# Altium footprint library HARTING THD.PcbLib: 113 footprints (part 3 of 11)
Each footprint in its own frame and in the unit in brackets; x right, y up, seen from the top. Pads: shape width x height; smd on the part's side, far side on the other; paste and mask are expansions set on the pad; w line width, h text height; cw(c..) or ccw(c..) is an arc to the next point about the centre after c.
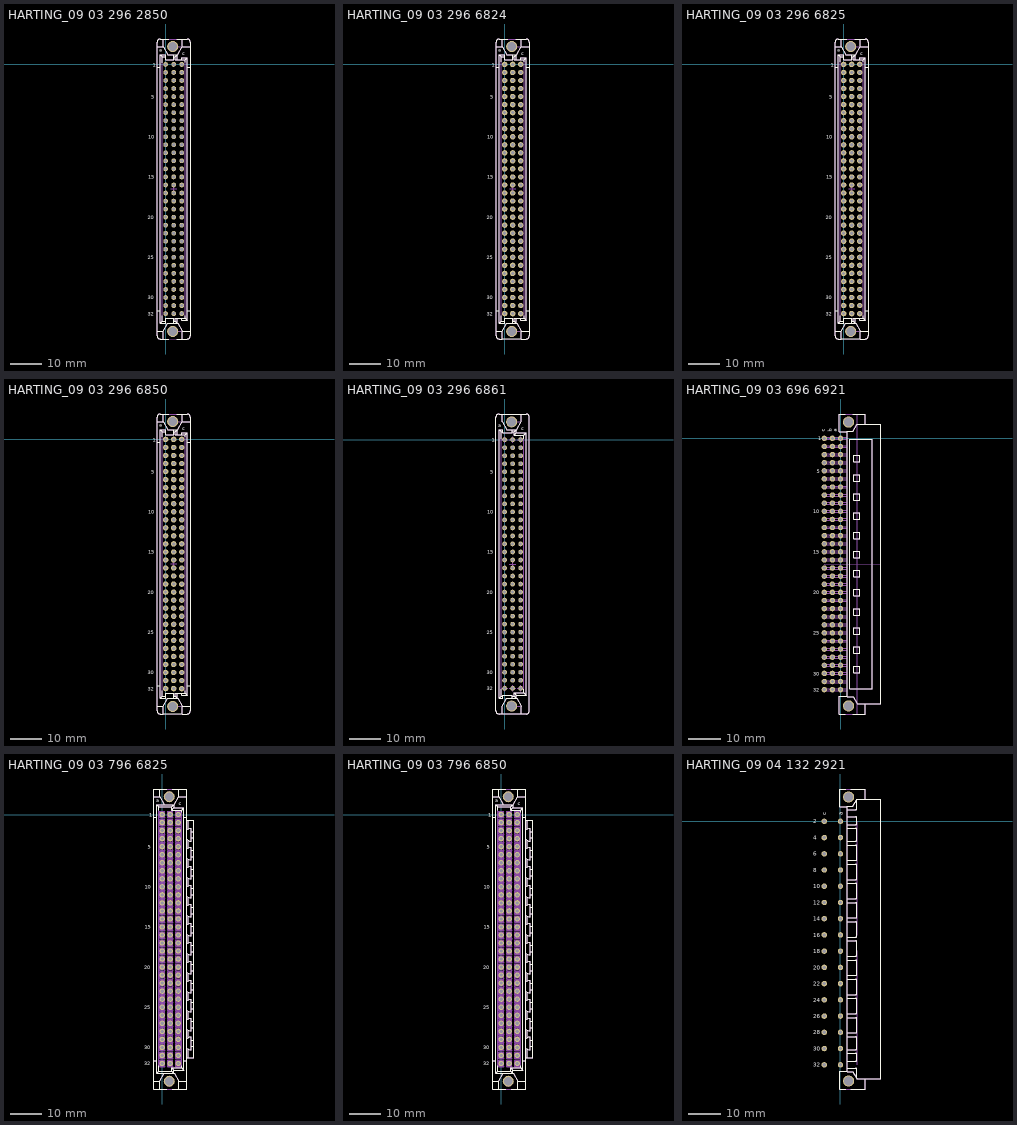
[diagram p2: the footprints below, top view; thin cyan lines are the x and y axes]

## HARTING_09 03 296 2850 [mm] "DIN 41612, Type C,  Thru-Hole Press-in Terminations; Rows a+b+c, 96 Position, Performance level 1, Lead 4.5mm, Pitch 2.54mm, Straight Female Connector"
height 11.6
pads (98):
  round 1.5 hole 1: a1(0,0) a2(0,-2.54) a3(0,-5.08) a4(0,-7.62) a5(0,-10.16) a6(0,-12.7) a7(0,-15.24) a8(0,-17.78) a9(0,-20.32) a10(0,-22.86) a11(0,-25.4) a12(0,-27.94) a13(0,-30.48) a14(0,-33.02) a15(0,-35.56) a16(0,-38.1) a17(0,-40.64) a18(0,-43.18) a19(0,-45.72) a20(0,-48.26) a21(0,-50.8) a22(0,-53.34) a23(0,-55.88) a24(0,-58.42) a25(0,-60.96) a26(0,-63.5) a27(0,-66.04) a28(0,-68.58) a29(0,-71.12) a30(0,-73.66) a31(0,-76.2) a32(0,-78.74) b1(2.54,0) b2(2.54,-2.54) b3(2.54,-5.08) b4(2.54,-7.62) b5(2.54,-10.16) b6(2.54,-12.7) b7(2.54,-15.24) b8(2.54,-17.78) b9(2.54,-20.32) b10(2.54,-22.86) b11(2.54,-25.4) b12(2.54,-27.94) b13(2.54,-30.48) b14(2.54,-33.02) b15(2.54,-35.56) b16(2.54,-38.1) b17(2.54,-40.64) b18(2.54,-43.18) b19(2.54,-45.72) b20(2.54,-48.26) b21(2.54,-50.8) b22(2.54,-53.34) b23(2.54,-55.88) b24(2.54,-58.42) b25(2.54,-60.96) b26(2.54,-63.5) b27(2.54,-66.04) b28(2.54,-68.58) b29(2.54,-71.12) b30(2.54,-73.66) b31(2.54,-76.2) b32(2.54,-78.74) c1(5.08,0) c2(5.08,-2.54) c3(5.08,-5.08) c4(5.08,-7.62) c5(5.08,-10.16) c6(5.08,-12.7) c7(5.08,-15.24) c8(5.08,-17.78) c9(5.08,-20.32) c10(5.08,-22.86) c11(5.08,-25.4) c12(5.08,-27.94) c13(5.08,-30.48) c14(5.08,-33.02) c15(5.08,-35.56) c16(5.08,-38.1) c17(5.08,-40.64) c18(5.08,-43.18) c19(5.08,-45.72) c20(5.08,-48.26) c21(5.08,-50.8) c22(5.08,-53.34) c23(5.08,-55.88) c24(5.08,-58.42) c25(5.08,-60.96) c26(5.08,-63.5) c27(5.08,-66.04) c28(5.08,-68.58) c29(5.08,-71.12) c30(5.08,-73.66) c31(5.08,-76.2) c32(5.08,-78.74)
  round 3.5 / inner round 3.5 / far side round 5.1 hole 2.8: MTG1(2.24,5.63) MTG2(2.24,-84.37)
Top Overlay:
  lines w0.2: -2.71,-84.37 -0.735,-84.37 ; -2.71,-77.87 -1.685,-77.87 ; -1.685,-0.87 -2.71,-0.87 -2.71,5.63 -0.735,5.63 ; -1.035,-79.41 -1.035,-81.195 ; -1.035,0.55 -1.035,2.455 ; 1,-86.77 -0.735,-86.77 ; 1,8.03 -0.735,8.03 ; 2.54,-81.845 2.54,-81.195 ; 2.54,3.105 2.54,2.455 ; 3.5,-86.77 5.215,-86.77 ; 3.5,8.03 5.215,8.03 ; 3.665,-80.145 3.665,-81.845 3.015,-81.195 ; 3.665,1.405 3.665,3.105 3.015,2.455 ; 6.115,-79.345 6.115,-80.145 ; 6.115,0.605 6.115,1.405 ; 6.765,-77.87 7.79,-77.87 ; 6.765,-0.87 7.79,-0.87 ; 7.79,-84.37 5.215,-84.37 ; 7.79,5.63 5.215,5.63 ; -1.685,-81.845 -1.685,3.105 ; -1.685,-81.845 -1.035,-81.195 ; -1.685,-81.845 0,-81.845 0,-81.195 ; -1.685,3.105 0,3.105 0,2.455 ; -1.685,3.105 -1.035,2.455 ; -1.035,-81.195 0,-81.195 ; -1.035,2.455 0,2.455 ; -0.735,-86.77 -0.735,-84.37 ; -0.735,-86.77 -1.71,-86.77 cw(c-1.71,-85.77) -2.71,-85.77 -2.71,7.03 cw(c-1.71,7.03) -1.71,8.03 -0.735,8.03 ; -0.735,-84.37 0.723,-81.845 3.757,-81.845 5.215,-84.37 ; -0.735,5.63 -0.735,8.03 ; -0.735,5.63 0.723,3.105 3.757,3.105 5.215,5.63 ; 0,-81.195 0,-80.145 2.54,-80.145 2.54,-81.195 ; 0,2.455 0,1.405 2.54,1.405 2.54,2.455 ; 2.54,-81.195 3.015,-81.195 ; 2.54,2.455 3.015,2.455 ; 3.015,-81.195 3.015,-80.145 5.08,-80.145 ; 3.015,2.455 3.015,1.405 5.08,1.405 ; 5.08,-80.145 6.115,-80.145 ; 5.08,-80.145 5.08,-80.795 6.765,-80.795 ; 5.08,1.405 5.08,2.055 6.765,2.055 ; 5.08,1.405 6.115,1.405 ; 5.215,-86.77 5.215,-84.37 ; 5.215,-86.77 6.79,-86.77 ccw(c6.79,-85.77) 7.79,-85.77 7.79,7.03 ccw(c6.79,7.03) 6.79,8.03 5.215,8.03 ; 5.215,5.63 5.215,8.03 ; 6.115,-80.145 6.765,-80.795 ; 6.115,1.405 6.765,2.055 ; 6.765,-80.795 6.765,2.055
  text "a" at -1.951,3.96 h1.2
  text "c" at 5.305,2.935 h1.2
  text "10" at -5.475,-23.46 h1.2
  text "32" at -5.675,-79.365 h1.2
  text "5" at -4.55,-10.835 h1.2
  text "30" at -5.675,-74.285 h1.2
  text "25" at -5.675,-61.585 h1.2
  text "20" at -5.675,-48.885 h1.2
  text "15" at -5.475,-36.135 h1.2
  text "1" at -4.075,-0.675 h1.2
Mechanical 8:
  lines w0.1: 1.54,-39.37 2.54,-39.37 ; 2.24,-84.37 4.78,-84.37 ; 2.24,5.63 4.78,5.63 ; 2.54,-40.37 2.54,-39.37 ; 2.54,-38.37 2.54,-39.37 ; 3.54,-39.37 2.54,-39.37
Mechanical 14:
  circle w0.1: c2.24,5.63 r1.425
  circle w0.1: c2.24,-84.37 r1.425
  lines w0.1: -2.71,-84.37 -0.735,-84.37 ; -2.71,5.63 -0.735,5.63 ; -0.735,-86.77 -0.735,-84.37 ; -0.735,8.03 -0.735,5.63 ; 3.665,-80.145 3.665,-81.845 ; 3.665,1.405 3.665,3.105 3.015,2.455 ; 3.757,3.105 5.215,5.63 ; 5.215,-86.77 5.215,-84.37 ; 5.215,8.03 5.215,5.63 ; 7.79,-84.37 5.215,-84.37 ; 7.79,5.63 5.215,5.63 ; -1.685,-81.845 -1.685,3.105 ; -1.685,-81.845 0,-81.845 0,-81.195 ; -1.685,-81.845 -1.035,-81.195 ; -1.685,3.105 0,3.105 0,2.455 ; -1.685,3.105 -1.035,2.455 ; -1.035,-81.195 0,-81.195 ; -1.035,-81.195 -1.035,2.455 ; -1.035,2.455 0,2.455 ; -0.735,-84.37 0.723,-81.845 2.54,-81.845 ; -0.735,5.63 0.723,3.105 2.54,3.105 2.54,2.455 ; 0,-81.195 0,-80.145 2.54,-80.145 2.54,-81.195 ; 0,2.455 0,1.405 2.54,1.405 2.54,2.455 ; 2.54,-81.845 3.665,-81.845 ; 2.54,-81.845 2.54,-81.195 ; 2.54,-81.195 3.015,-81.195 ; 2.54,2.455 3.015,2.455 ; 3.015,-81.195 3.665,-81.845 ; 3.015,-81.195 3.015,-80.145 5.08,-80.145 ; 3.015,2.455 3.015,1.405 5.08,1.405 ; 3.665,-81.845 3.757,-81.845 5.215,-84.37 ; 5.08,-80.145 5.08,-80.795 6.765,-80.795 ; 5.08,-80.145 6.115,-80.145 ; 5.08,1.405 5.08,2.055 6.765,2.055 ; 5.08,1.405 6.115,1.405 ; 6.115,-80.145 6.765,-80.795 ; 6.115,-80.145 6.115,1.405 ; 6.115,1.405 6.765,2.055 ; 6.765,-80.795 6.765,2.055 ; -2.71,-85.77 ccw(c-1.71,-85.77) -1.71,-86.77 6.79,-86.77 ccw(c6.79,-85.77) 7.79,-85.77 7.79,7.03 ccw(c6.79,7.03) 6.79,8.03 -1.71,8.03 ccw(c-1.71,7.03) -2.71,7.03 -2.71,-85.77
  text "a" at -1.951,3.96 h1.2
  text "c" at 5.305,2.935 h1.2
  text "10" at -5.475,-23.46 h1.2
  text "32" at -5.675,-79.365 h1.2
  text "5" at -4.55,-10.835 h1.2
  text "30" at -5.675,-74.285 h1.2
  text "25" at -5.675,-61.585 h1.2
  text "20" at -5.675,-48.885 h1.2
  text "15" at -5.475,-36.135 h1.2
  text "1" at -4.075,-0.675 h1.2
Drill Drawing:
  lines w0.1: -2.54,-58.42 -2.54,-81.28 7.62,-81.28 7.62,2.54 -2.54,2.54 -2.54,-20.32
  text "PRESS-FIT TECHNOLOGY diam. 1mm +0.1 -0" at -1.905,-56.515 h1
3D body "HARTING_09 03 296 2850.stp": height 11.6, standoff -4.5, extent -2.71,-86.82 7.79,8.08

## HARTING_09 03 296 6824 [mm] "DIN 41612, Type C,  Thru-Hole; Rows a+b+c, 96 Position, Performance level 2, Lead 2.9mm, Pitch 2.54mm, Straight Female Connector"
height 11.6
pads (98):
  round 1.7 hole 1: a1(0,0) a2(0,-2.54) a3(0,-5.08) a4(0,-7.62) a5(0,-10.16) a6(0,-12.7) a7(0,-15.24) a8(0,-17.78) a9(0,-20.32) a10(0,-22.86) a11(0,-25.4) a12(0,-27.94) a13(0,-30.48) a14(0,-33.02) a15(0,-35.56) a16(0,-38.1) a17(0,-40.64) a18(0,-43.18) a19(0,-45.72) a20(0,-48.26) a21(0,-50.8) a22(0,-53.34) a23(0,-55.88) a24(0,-58.42) a25(0,-60.96) a26(0,-63.5) a27(0,-66.04) a28(0,-68.58) a29(0,-71.12) a30(0,-73.66) a31(0,-76.2) a32(0,-78.74) b1(2.54,0) b2(2.54,-2.54) b3(2.54,-5.08) b4(2.54,-7.62) b5(2.54,-10.16) b6(2.54,-12.7) b7(2.54,-15.24) b8(2.54,-17.78) b9(2.54,-20.32) b10(2.54,-22.86) b11(2.54,-25.4) b12(2.54,-27.94) b13(2.54,-30.48) b14(2.54,-33.02) b15(2.54,-35.56) b16(2.54,-38.1) b17(2.54,-40.64) b18(2.54,-43.18) b19(2.54,-45.72) b20(2.54,-48.26) b21(2.54,-50.8) b22(2.54,-53.34) b23(2.54,-55.88) b24(2.54,-58.42) b25(2.54,-60.96) b26(2.54,-63.5) b27(2.54,-66.04) b28(2.54,-68.58) b29(2.54,-71.12) b30(2.54,-73.66) b31(2.54,-76.2) b32(2.54,-78.74) c1(5.08,0) c2(5.08,-2.54) c3(5.08,-5.08) c4(5.08,-7.62) c5(5.08,-10.16) c6(5.08,-12.7) c7(5.08,-15.24) c8(5.08,-17.78) c9(5.08,-20.32) c10(5.08,-22.86) c11(5.08,-25.4) c12(5.08,-27.94) c13(5.08,-30.48) c14(5.08,-33.02) c15(5.08,-35.56) c16(5.08,-38.1) c17(5.08,-40.64) c18(5.08,-43.18) c19(5.08,-45.72) c20(5.08,-48.26) c21(5.08,-50.8) c22(5.08,-53.34) c23(5.08,-55.88) c24(5.08,-58.42) c25(5.08,-60.96) c26(5.08,-63.5) c27(5.08,-66.04) c28(5.08,-68.58) c29(5.08,-71.12) c30(5.08,-73.66) c31(5.08,-76.2) c32(5.08,-78.74)
  round 3.5 / inner round 3.5 / far side round 5.1 hole 2.8: MTG1(2.24,5.63) MTG2(2.24,-84.37)
Top Overlay:
  lines w0.2: -2.71,-84.37 -0.735,-84.37 ; -2.71,-77.87 -1.685,-77.87 ; -1.685,-0.87 -2.71,-0.87 -2.71,5.63 -0.735,5.63 ; -1.035,-79.4 -1.035,-81.195 ; -1.035,0.775 -1.035,2.455 ; 1,8.03 -0.735,8.03 ; 2.54,-81.845 2.54,-81.195 ; 2.54,3.105 2.54,2.455 ; 3.5,8.03 5.215,8.03 ; 3.665,-80.145 3.665,-81.845 3.015,-81.195 ; 3.665,1.405 3.665,3.105 3.015,2.455 ; 6.115,-79.425 6.115,-80.145 ; 6.115,0.825 6.115,1.405 ; 6.765,-77.87 7.79,-77.87 ; 6.765,-0.87 7.79,-0.87 ; 7.79,-84.37 5.215,-84.37 ; 7.79,5.63 5.215,5.63 ; -1.685,-81.845 0,-81.845 0,-81.195 ; -1.685,-81.845 -1.035,-81.195 ; -1.685,-81.845 -1.685,3.105 ; -1.685,3.105 -1.035,2.455 ; -1.685,3.105 0,3.105 0,2.455 ; -1.035,-81.195 0,-81.195 ; -1.035,2.455 0,2.455 ; -0.735,-86.77 -1.71,-86.77 cw(c-1.71,-85.77) -2.71,-85.77 -2.71,7.03 cw(c-1.71,7.03) -1.71,8.03 -0.735,8.03 ; -0.735,-86.77 5.215,-86.77 ; -0.735,-86.77 -0.735,-84.37 ; -0.735,-84.37 0.723,-81.845 3.757,-81.845 5.215,-84.37 ; -0.735,5.63 0.723,3.105 3.757,3.105 5.215,5.63 ; -0.735,5.63 -0.735,8.03 ; 0,-81.195 0,-80.145 2.54,-80.145 2.54,-81.195 ; 0,2.455 0,1.405 2.54,1.405 2.54,2.455 ; 2.54,-81.195 3.015,-81.195 ; 2.54,2.455 3.015,2.455 ; 3.015,-81.195 3.015,-80.145 5.08,-80.145 ; 3.015,2.455 3.015,1.405 5.08,1.405 ; 5.08,-80.145 5.08,-80.795 6.765,-80.795 ; 5.08,-80.145 6.115,-80.145 ; 5.08,1.405 6.115,1.405 ; 5.08,1.405 5.08,2.055 6.765,2.055 ; 5.215,-86.77 6.79,-86.77 ccw(c6.79,-85.77) 7.79,-85.77 7.79,7.03 ccw(c6.79,7.03) 6.79,8.03 5.215,8.03 ; 5.215,-86.77 5.215,-84.37 ; 5.215,5.63 5.215,8.03 ; 6.115,-80.145 6.765,-80.795 ; 6.115,1.405 6.765,2.055 ; 6.765,-80.795 6.765,2.055
  text "1" at -4.075,-0.675 h1.2
  text "15" at -5.475,-36.135 h1.2
  text "20" at -5.675,-48.885 h1.2
  text "25" at -5.675,-61.585 h1.2
  text "30" at -5.675,-74.285 h1.2
  text "5" at -4.55,-10.835 h1.2
  text "32" at -5.675,-79.365 h1.2
  text "10" at -5.475,-23.46 h1.2
  text "c" at 5.305,2.935 h1.2
  text "a" at -1.951,3.96 h1.2
Mechanical 8:
  lines w0.1: 1.54,-39.37 2.54,-39.37 ; 2.24,-84.37 4.78,-84.37 ; 2.24,5.63 4.78,5.63 ; 2.54,-40.37 2.54,-39.37 ; 2.54,-38.37 2.54,-39.37 ; 3.54,-39.37 2.54,-39.37
Mechanical 14:
  circle w0.1: c2.24,-84.37 r1.425
  circle w0.1: c2.24,5.63 r1.425
  lines w0.1: -2.71,-84.37 -0.735,-84.37 ; -2.71,5.63 -0.735,5.63 ; -0.735,-86.77 -0.735,-84.37 ; -0.735,8.03 -0.735,5.63 ; 3.665,-80.145 3.665,-81.845 ; 3.665,1.405 3.665,3.105 3.015,2.455 ; 3.757,3.105 5.215,5.63 ; 5.215,-86.77 5.215,-84.37 ; 5.215,8.03 5.215,5.63 ; 7.79,-84.37 5.215,-84.37 ; 7.79,5.63 5.215,5.63 ; -1.685,-81.845 -1.035,-81.195 ; -1.685,-81.845 0,-81.845 0,-81.195 ; -1.685,-81.845 -1.685,3.105 ; -1.685,3.105 -1.035,2.455 ; -1.685,3.105 0,3.105 0,2.455 ; -1.035,-81.195 -1.035,2.455 ; -1.035,-81.195 0,-81.195 ; -1.035,2.455 0,2.455 ; -0.735,-84.37 0.723,-81.845 2.54,-81.845 ; -0.735,5.63 0.723,3.105 2.54,3.105 2.54,2.455 ; 0,-81.195 0,-80.145 2.54,-80.145 2.54,-81.195 ; 0,2.455 0,1.405 2.54,1.405 2.54,2.455 ; 2.54,-81.845 2.54,-81.195 ; 2.54,-81.845 3.665,-81.845 ; 2.54,-81.195 3.015,-81.195 ; 2.54,2.455 3.015,2.455 ; 3.015,-81.195 3.015,-80.145 5.08,-80.145 ; 3.015,-81.195 3.665,-81.845 ; 3.015,2.455 3.015,1.405 5.08,1.405 ; 3.665,-81.845 3.757,-81.845 5.215,-84.37 ; 5.08,-80.145 6.115,-80.145 ; 5.08,-80.145 5.08,-80.795 6.765,-80.795 ; 5.08,1.405 6.115,1.405 ; 5.08,1.405 5.08,2.055 6.765,2.055 ; 6.115,-80.145 6.115,1.405 ; 6.115,-80.145 6.765,-80.795 ; 6.115,1.405 6.765,2.055 ; 6.765,-80.795 6.765,2.055 ; -2.71,-85.77 ccw(c-1.71,-85.77) -1.71,-86.77 6.79,-86.77 ccw(c6.79,-85.77) 7.79,-85.77 7.79,7.03 ccw(c6.79,7.03) 6.79,8.03 -1.71,8.03 ccw(c-1.71,7.03) -2.71,7.03 -2.71,-85.77
  text "1" at -4.075,-0.675 h1.2
  text "15" at -5.475,-36.135 h1.2
  text "20" at -5.675,-48.885 h1.2
  text "25" at -5.675,-61.585 h1.2
  text "30" at -5.675,-74.285 h1.2
  text "5" at -4.55,-10.835 h1.2
  text "32" at -5.675,-79.365 h1.2
  text "10" at -5.475,-23.46 h1.2
  text "c" at 5.305,2.935 h1.2
  text "a" at -1.951,3.96 h1.2
3D body "HARTING_09 03 296 6824.stp": height 11.6, standoff -2.9, extent -2.71,-86.82 7.79,8.08

## HARTING_09 03 296 6825 [mm] "DIN 41612, Type C,  Thru-Hole; Rows a+b+c, 96 Position, Performance level 2, Lead 4.5mm, Pitch 2.54mm, Straight Female Connector"
height 11.6
pads (98):
  round 1.7 hole 1: a1(0,0) a2(0,-2.54) a3(0,-5.08) a4(0,-7.62) a5(0,-10.16) a6(0,-12.7) a7(0,-15.24) a8(0,-17.78) a9(0,-20.32) a10(0,-22.86) a11(0,-25.4) a12(0,-27.94) a13(0,-30.48) a14(0,-33.02) a15(0,-35.56) a16(0,-38.1) a17(0,-40.64) a18(0,-43.18) a19(0,-45.72) a20(0,-48.26) a21(0,-50.8) a22(0,-53.34) a23(0,-55.88) a24(0,-58.42) a25(0,-60.96) a26(0,-63.5) a27(0,-66.04) a28(0,-68.58) a29(0,-71.12) a30(0,-73.66) a31(0,-76.2) a32(0,-78.74) b1(2.54,0) b2(2.54,-2.54) b3(2.54,-5.08) b4(2.54,-7.62) b5(2.54,-10.16) b6(2.54,-12.7) b7(2.54,-15.24) b8(2.54,-17.78) b9(2.54,-20.32) b10(2.54,-22.86) b11(2.54,-25.4) b12(2.54,-27.94) b13(2.54,-30.48) b14(2.54,-33.02) b15(2.54,-35.56) b16(2.54,-38.1) b17(2.54,-40.64) b18(2.54,-43.18) b19(2.54,-45.72) b20(2.54,-48.26) b21(2.54,-50.8) b22(2.54,-53.34) b23(2.54,-55.88) b24(2.54,-58.42) b25(2.54,-60.96) b26(2.54,-63.5) b27(2.54,-66.04) b28(2.54,-68.58) b29(2.54,-71.12) b30(2.54,-73.66) b31(2.54,-76.2) b32(2.54,-78.74) c1(5.08,0) c2(5.08,-2.54) c3(5.08,-5.08) c4(5.08,-7.62) c5(5.08,-10.16) c6(5.08,-12.7) c7(5.08,-15.24) c8(5.08,-17.78) c9(5.08,-20.32) c10(5.08,-22.86) c11(5.08,-25.4) c12(5.08,-27.94) c13(5.08,-30.48) c14(5.08,-33.02) c15(5.08,-35.56) c16(5.08,-38.1) c17(5.08,-40.64) c18(5.08,-43.18) c19(5.08,-45.72) c20(5.08,-48.26) c21(5.08,-50.8) c22(5.08,-53.34) c23(5.08,-55.88) c24(5.08,-58.42) c25(5.08,-60.96) c26(5.08,-63.5) c27(5.08,-66.04) c28(5.08,-68.58) c29(5.08,-71.12) c30(5.08,-73.66) c31(5.08,-76.2) c32(5.08,-78.74)
  round 3.5 / inner round 3.5 / far side round 5.1 hole 2.8: MTG1(2.24,5.63) MTG2(2.24,-84.37)
Top Overlay:
  lines w0.2: -2.71,-84.37 -0.735,-84.37 ; -2.71,-77.87 -1.685,-77.87 ; -1.685,-0.87 -2.71,-0.87 -2.71,5.63 -0.735,5.63 ; -1.035,-79.4 -1.035,-81.195 ; -1.035,0.775 -1.035,2.455 ; 1,8.03 -0.735,8.03 ; 2.54,-81.845 2.54,-81.195 ; 2.54,3.105 2.54,2.455 ; 3.5,8.03 5.215,8.03 ; 3.665,-80.145 3.665,-81.845 3.015,-81.195 ; 3.665,1.405 3.665,3.105 3.015,2.455 ; 6.115,-79.425 6.115,-80.145 ; 6.115,0.825 6.115,1.405 ; 6.765,-77.87 7.79,-77.87 ; 6.765,-0.87 7.79,-0.87 ; 7.79,-84.37 5.215,-84.37 ; 7.79,5.63 5.215,5.63 ; -1.685,-81.845 0,-81.845 0,-81.195 ; -1.685,-81.845 -1.035,-81.195 ; -1.685,-81.845 -1.685,3.105 ; -1.685,3.105 -1.035,2.455 ; -1.685,3.105 0,3.105 0,2.455 ; -1.035,-81.195 0,-81.195 ; -1.035,2.455 0,2.455 ; -0.735,-86.77 -1.71,-86.77 cw(c-1.71,-85.77) -2.71,-85.77 -2.71,7.03 cw(c-1.71,7.03) -1.71,8.03 -0.735,8.03 ; -0.735,-86.77 5.215,-86.77 ; -0.735,-86.77 -0.735,-84.37 ; -0.735,-84.37 0.723,-81.845 3.757,-81.845 5.215,-84.37 ; -0.735,5.63 0.723,3.105 3.757,3.105 5.215,5.63 ; -0.735,5.63 -0.735,8.03 ; 0,-81.195 0,-80.145 2.54,-80.145 2.54,-81.195 ; 0,2.455 0,1.405 2.54,1.405 2.54,2.455 ; 2.54,-81.195 3.015,-81.195 ; 2.54,2.455 3.015,2.455 ; 3.015,-81.195 3.015,-80.145 5.08,-80.145 ; 3.015,2.455 3.015,1.405 5.08,1.405 ; 5.08,-80.145 5.08,-80.795 6.765,-80.795 ; 5.08,-80.145 6.115,-80.145 ; 5.08,1.405 6.115,1.405 ; 5.08,1.405 5.08,2.055 6.765,2.055 ; 5.215,-86.77 6.79,-86.77 ccw(c6.79,-85.77) 7.79,-85.77 7.79,7.03 ccw(c6.79,7.03) 6.79,8.03 5.215,8.03 ; 5.215,-86.77 5.215,-84.37 ; 5.215,5.63 5.215,8.03 ; 6.115,-80.145 6.765,-80.795 ; 6.115,1.405 6.765,2.055 ; 6.765,-80.795 6.765,2.055
  text "1" at -4.075,-0.675 h1.2
  text "15" at -5.475,-36.135 h1.2
  text "20" at -5.675,-48.885 h1.2
  text "25" at -5.675,-61.585 h1.2
  text "30" at -5.675,-74.285 h1.2
  text "5" at -4.55,-10.835 h1.2
  text "32" at -5.675,-79.365 h1.2
  text "10" at -5.475,-23.46 h1.2
  text "c" at 5.305,2.935 h1.2
  text "a" at -1.951,3.96 h1.2
Mechanical 8:
  lines w0.1: 1.54,-39.37 2.54,-39.37 ; 2.24,-84.37 4.78,-84.37 ; 2.24,5.63 4.78,5.63 ; 2.54,-40.37 2.54,-39.37 ; 2.54,-38.37 2.54,-39.37 ; 3.54,-39.37 2.54,-39.37
Mechanical 14:
  circle w0.1: c2.24,-84.37 r1.425
  circle w0.1: c2.24,5.63 r1.425
  lines w0.1: -2.71,-84.37 -0.735,-84.37 ; -2.71,5.63 -0.735,5.63 ; -0.735,-86.77 -0.735,-84.37 ; -0.735,8.03 -0.735,5.63 ; 3.665,-80.145 3.665,-81.845 ; 3.665,1.405 3.665,3.105 3.015,2.455 ; 3.757,3.105 5.215,5.63 ; 5.215,-86.77 5.215,-84.37 ; 5.215,8.03 5.215,5.63 ; 7.79,-84.37 5.215,-84.37 ; 7.79,5.63 5.215,5.63 ; -1.685,-81.845 -1.035,-81.195 ; -1.685,-81.845 0,-81.845 0,-81.195 ; -1.685,-81.845 -1.685,3.105 ; -1.685,3.105 -1.035,2.455 ; -1.685,3.105 0,3.105 0,2.455 ; -1.035,-81.195 -1.035,2.455 ; -1.035,-81.195 0,-81.195 ; -1.035,2.455 0,2.455 ; -0.735,-84.37 0.723,-81.845 2.54,-81.845 ; -0.735,5.63 0.723,3.105 2.54,3.105 2.54,2.455 ; 0,-81.195 0,-80.145 2.54,-80.145 2.54,-81.195 ; 0,2.455 0,1.405 2.54,1.405 2.54,2.455 ; 2.54,-81.845 2.54,-81.195 ; 2.54,-81.845 3.665,-81.845 ; 2.54,-81.195 3.015,-81.195 ; 2.54,2.455 3.015,2.455 ; 3.015,-81.195 3.015,-80.145 5.08,-80.145 ; 3.015,-81.195 3.665,-81.845 ; 3.015,2.455 3.015,1.405 5.08,1.405 ; 3.665,-81.845 3.757,-81.845 5.215,-84.37 ; 5.08,-80.145 6.115,-80.145 ; 5.08,-80.145 5.08,-80.795 6.765,-80.795 ; 5.08,1.405 6.115,1.405 ; 5.08,1.405 5.08,2.055 6.765,2.055 ; 6.115,-80.145 6.115,1.405 ; 6.115,-80.145 6.765,-80.795 ; 6.115,1.405 6.765,2.055 ; 6.765,-80.795 6.765,2.055 ; -2.71,-85.77 ccw(c-1.71,-85.77) -1.71,-86.77 6.79,-86.77 ccw(c6.79,-85.77) 7.79,-85.77 7.79,7.03 ccw(c6.79,7.03) 6.79,8.03 -1.71,8.03 ccw(c-1.71,7.03) -2.71,7.03 -2.71,-85.77
  text "1" at -4.075,-0.675 h1.2
  text "15" at -5.475,-36.135 h1.2
  text "20" at -5.675,-48.885 h1.2
  text "25" at -5.675,-61.585 h1.2
  text "30" at -5.675,-74.285 h1.2
  text "5" at -4.55,-10.835 h1.2
  text "32" at -5.675,-79.365 h1.2
  text "10" at -5.475,-23.46 h1.2
  text "c" at 5.305,2.935 h1.2
  text "a" at -1.951,3.96 h1.2
3D body "HARTING_09 03 296 6825.stp": height 11.6, standoff -4.5, extent -2.71,-86.82 7.79,8.08

## HARTING_09 03 296 6850 [mm] "DIN 41612, Type C,  Thru-Hole Press-in Terminations; Rows a+b+c, 96 Position, Performance level 2, Lead 4.5mm, Pitch 2.54mm, Straight Female Connector"
height 11.6
pads (98):
  round 1.7 hole 1: a1(0,0) a2(0,-2.54) a3(0,-5.08) a4(0,-7.62) a5(0,-10.16) a6(0,-12.7) a7(0,-15.24) a8(0,-17.78) a9(0,-20.32) a10(0,-22.86) a11(0,-25.4) a12(0,-27.94) a13(0,-30.48) a14(0,-33.02) a15(0,-35.56) a16(0,-38.1) a17(0,-40.64) a18(0,-43.18) a19(0,-45.72) a20(0,-48.26) a21(0,-50.8) a22(0,-53.34) a23(0,-55.88) a24(0,-58.42) a25(0,-60.96) a26(0,-63.5) a27(0,-66.04) a28(0,-68.58) a29(0,-71.12) a30(0,-73.66) a31(0,-76.2) a32(0,-78.74) b1(2.54,0) b2(2.54,-2.54) b3(2.54,-5.08) b4(2.54,-7.62) b5(2.54,-10.16) b6(2.54,-12.7) b7(2.54,-15.24) b8(2.54,-17.78) b9(2.54,-20.32) b10(2.54,-22.86) b11(2.54,-25.4) b12(2.54,-27.94) b13(2.54,-30.48) b14(2.54,-33.02) b15(2.54,-35.56) b16(2.54,-38.1) b17(2.54,-40.64) b18(2.54,-43.18) b19(2.54,-45.72) b20(2.54,-48.26) b21(2.54,-50.8) b22(2.54,-53.34) b23(2.54,-55.88) b24(2.54,-58.42) b25(2.54,-60.96) b26(2.54,-63.5) b27(2.54,-66.04) b28(2.54,-68.58) b29(2.54,-71.12) b30(2.54,-73.66) b31(2.54,-76.2) b32(2.54,-78.74) c1(5.08,0) c2(5.08,-2.54) c3(5.08,-5.08) c4(5.08,-7.62) c5(5.08,-10.16) c6(5.08,-12.7) c7(5.08,-15.24) c8(5.08,-17.78) c9(5.08,-20.32) c10(5.08,-22.86) c11(5.08,-25.4) c12(5.08,-27.94) c13(5.08,-30.48) c14(5.08,-33.02) c15(5.08,-35.56) c16(5.08,-38.1) c17(5.08,-40.64) c18(5.08,-43.18) c19(5.08,-45.72) c20(5.08,-48.26) c21(5.08,-50.8) c22(5.08,-53.34) c23(5.08,-55.88) c24(5.08,-58.42) c25(5.08,-60.96) c26(5.08,-63.5) c27(5.08,-66.04) c28(5.08,-68.58) c29(5.08,-71.12) c30(5.08,-73.66) c31(5.08,-76.2) c32(5.08,-78.74)
  round 3.5 / inner round 3.5 / far side round 5.1 hole 2.8: MTG1(2.24,5.63) MTG2(2.24,-84.37)
Top Overlay:
  lines w0.2: -2.71,-84.37 -0.735,-84.37 ; -2.71,-77.87 -1.685,-77.87 ; -1.685,-0.87 -2.71,-0.87 -2.71,5.63 -0.735,5.63 ; -1.035,-79.4 -1.035,-81.195 ; -1.035,0.775 -1.035,2.455 ; 1,8.03 -0.735,8.03 ; 2.54,-81.845 2.54,-81.195 ; 2.54,3.105 2.54,2.455 ; 3.5,8.03 5.215,8.03 ; 3.665,-80.145 3.665,-81.845 3.015,-81.195 ; 3.665,1.405 3.665,3.105 3.015,2.455 ; 6.115,-79.425 6.115,-80.145 ; 6.115,0.825 6.115,1.405 ; 6.765,-77.87 7.79,-77.87 ; 6.765,-0.87 7.79,-0.87 ; 7.79,-84.37 5.215,-84.37 ; 7.79,5.63 5.215,5.63 ; -1.685,-81.845 -1.685,3.105 ; -1.685,-81.845 -1.035,-81.195 ; -1.685,-81.845 0,-81.845 0,-81.195 ; -1.685,3.105 0,3.105 0,2.455 ; -1.685,3.105 -1.035,2.455 ; -1.035,-81.195 0,-81.195 ; -1.035,2.455 0,2.455 ; -0.735,-86.77 -0.735,-84.37 ; -0.735,-86.77 5.215,-86.77 ; -0.735,-86.77 -1.71,-86.77 cw(c-1.71,-85.77) -2.71,-85.77 -2.71,7.03 cw(c-1.71,7.03) -1.71,8.03 -0.735,8.03 ; -0.735,-84.37 0.723,-81.845 3.757,-81.845 5.215,-84.37 ; -0.735,5.63 -0.735,8.03 ; -0.735,5.63 0.723,3.105 3.757,3.105 5.215,5.63 ; 0,-81.195 0,-80.145 2.54,-80.145 2.54,-81.195 ; 0,2.455 0,1.405 2.54,1.405 2.54,2.455 ; 2.54,-81.195 3.015,-81.195 ; 2.54,2.455 3.015,2.455 ; 3.015,-81.195 3.015,-80.145 5.08,-80.145 ; 3.015,2.455 3.015,1.405 5.08,1.405 ; 5.08,-80.145 6.115,-80.145 ; 5.08,-80.145 5.08,-80.795 6.765,-80.795 ; 5.08,1.405 5.08,2.055 6.765,2.055 ; 5.08,1.405 6.115,1.405 ; 5.215,-86.77 5.215,-84.37 ; 5.215,-86.77 6.79,-86.77 ccw(c6.79,-85.77) 7.79,-85.77 7.79,7.03 ccw(c6.79,7.03) 6.79,8.03 5.215,8.03 ; 5.215,5.63 5.215,8.03 ; 6.115,-80.145 6.765,-80.795 ; 6.115,1.405 6.765,2.055 ; 6.765,-80.795 6.765,2.055
  text "a" at -1.951,3.96 h1.2
  text "c" at 5.305,2.935 h1.2
  text "10" at -5.475,-23.46 h1.2
  text "32" at -5.675,-79.365 h1.2
  text "5" at -4.55,-10.835 h1.2
  text "30" at -5.675,-74.285 h1.2
  text "25" at -5.675,-61.585 h1.2
  text "20" at -5.675,-48.885 h1.2